# Altium footprint library ICs And Semiconductors SMD.PcbLib: 943 footprints (part 15 of 60)
Each footprint in its own frame and in the unit in brackets; x right, y up, seen from the top. Pads: shape width x height; smd on the part's side, far side on the other; paste and mask are expansions set on the pad; w line width, h text height; cw(c..) or ccw(c..) is an arc to the next point about the centre after c.
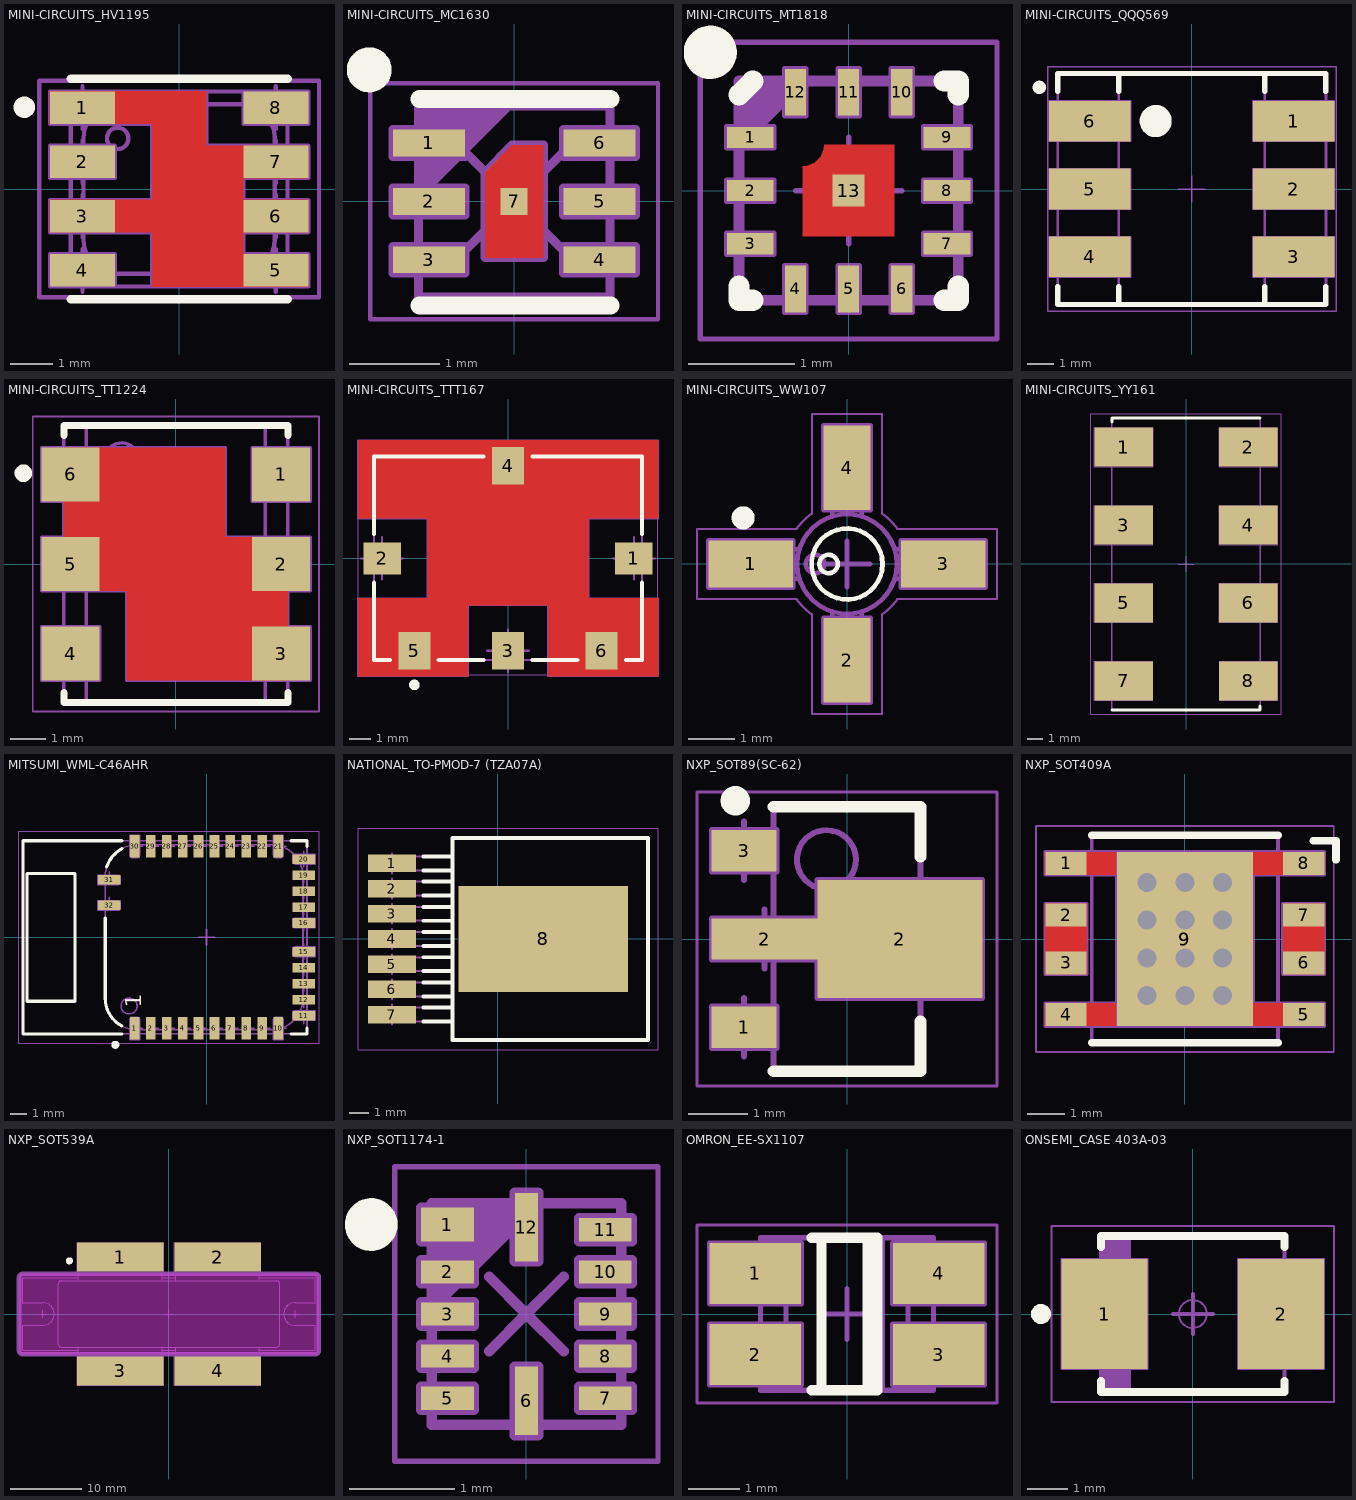
[diagram p14: the footprints below, top view; thin cyan lines are the x and y axes]

## MINI-CIRCUITS_HV1195 [mm] "MINI-CIRCUITS HV1195 Case, 1.27mm pitch; 8 pin, 4.57mm W X 5.08mm L"
height 2.21
pads (8):
  rect 1.52x0.76 smd: 1(-2.265,1.905) 2(-2.265,0.635) 3(-2.265,-0.635) 4(-2.265,-1.905) 5(2.265,-1.905) 6(2.265,-0.635) 7(2.265,0.635) 8(2.265,1.905)
Top Layer:
  region: -0.635,-2.285 -0.635,-1.015 -3.025,-1.015 -3.025,-0.255 -0.635,-0.255 -0.635,1.525 -3.025,1.525 -3.025,2.285 0.635,2.285 0.635,1.015 3.025,1.015 3.025,0.255 1.505,0.255 1.505,-0.255 3.025,-0.255 3.025,-1.015 1.505,-1.015 1.505,-1.525 3.025,-1.525 3.025,-2.285
Top Overlay:
  circle w0.25: c-3.625,1.915 r0.125
  lines w0.2: -2.54,-2.585 2.54,-2.585 ; -2.54,2.586 2.54,2.585
Mechanical 8:
  lines w0.1: -2.765,-1.905 -2.265,-1.905 ; -2.765,-0.635 -2.265,-0.635 ; -2.765,0.635 -2.265,0.635 ; -2.765,1.905 -2.265,1.905 ; -2.265,-2.405 -2.265,-1.905 ; -2.265,-1.405 -2.265,-1.905 ; -2.265,-1.135 -2.265,-0.635 ; -2.265,-0.135 -2.265,-0.635 ; -2.265,0.135 -2.265,0.635 ; -2.265,1.135 -2.265,0.635 ; -2.265,1.405 -2.265,1.905 ; -2.265,2.405 -2.265,1.905 ; -1.765,-1.905 -2.265,-1.905 ; -1.765,-0.635 -2.265,-0.635 ; -1.765,0.635 -2.265,0.635 ; -1.765,1.905 -2.265,1.905 ; -0.5,0 0,0 ; 0,-0.5 0,0 ; 0,0.5 0,0 ; 0.5,0 0,0 ; 1.765,-1.905 2.265,-1.905 ; 1.765,-0.635 2.265,-0.635 ; 1.765,0.635 2.265,0.635 ; 1.765,1.905 2.265,1.905 ; 2.265,-2.405 2.265,-1.905 ; 2.265,-1.405 2.265,-1.905 ; 2.265,-1.135 2.265,-0.635 ; 2.265,-0.135 2.265,-0.635 ; 2.265,0.135 2.265,0.635 ; 2.265,1.135 2.265,0.635 ; 2.265,1.405 2.265,1.905 ; 2.265,2.405 2.265,1.905 ; 2.765,-1.905 2.265,-1.905 ; 2.765,-0.635 2.265,-0.635 ; 2.765,0.635 2.265,0.635 ; 2.765,1.905 2.265,1.905 ; -3.025,-2.285 -1.505,-2.285 -1.505,-1.525 -3.025,-1.525 -3.025,-2.285 ; -3.025,-1.015 -0.635,-1.015 -0.635,-2.285 3.025,-2.285 3.025,-1.525 1.505,-1.525 1.505,-1.015 3.025,-1.015 3.025,-0.255 1.505,-0.255 1.505,0.255 3.025,0.255 3.025,1.015 0.635,1.015 0.635,2.285 -3.025,2.285 -3.025,1.525 -0.635,1.525 -0.635,-0.255 -3.025,-0.255 -3.025,-1.015 ; -3.025,0.255 -1.505,0.255 -1.505,1.015 -3.025,1.015 -3.025,0.255 ; 1.505,1.525 3.025,1.525 3.025,2.285 1.505,2.285 1.505,1.525
Mechanical 14:
  circle w0.1: c-1.44,1.185 r0.25
  lines w0.1: -2.54,-2.285 -2.54,2.285 2.54,2.285 2.54,-2.285 -2.54,-2.285 ; -2.24,-1.185 ccw(c-1.44,-1.185) -1.44,-1.985 1.44,-1.985 ccw(c1.44,-1.185) 2.24,-1.185 2.24,1.185 ccw(c1.44,1.185) 1.44,1.985 -1.44,1.985 ccw(c-1.44,1.185) -2.24,1.185 -2.24,-1.185
Mechanical 15:
  lines w0.1: -3.275,-2.535 3.275,-2.535 3.275,2.534 -3.275,2.535 -3.275,-2.535
3D body "MINI-CIRCUITS_HV1195.stp": height 2.21, standoff 0, extent -2.54,-2.285 2.54,2.285

## MINI-CIRCUITS_MC1630 [mm] "MINI-CIRCUITS MC1630 Case, 0.65mm pitch, 6 pin, 2mm X 2mm X 0.85mm H body (w/thermal tab 0.65 X 1.25mm)"
height 0.85
pads (7):
  rect 0.8x0.3 smd: 1(-0.95,0.65) 2(-0.95,0) 3(-0.95,-0.65) 4(0.95,-0.65) 5(0.95,0) 6(0.95,0.65)
  rect 0.3x0.3 smd: 7(0,0)
Top Layer:
  region: -0.325,-0.625 0.325,-0.625 0.325,0.625 -0.025,0.625 -0.325,0.325
Top Overlay:
  circle w0.25: c-1.613,1.463 r0.125
  lines w0.2: -1.054,-1.16 1.074,-1.16 ; -1.054,1.139 1.074,1.139
Mechanical 8:
  lines w0.1: -0.707,-0.707 0,0 ; -0.707,0.707 0,0 ; 0.707,-0.707 0,0 ; 0.707,0.707 0,0 ; -1.35,-0.8 -0.95,-0.65 -1.35,-0.5 ; -1.35,-0.8 -0.55,-0.8 -0.55,-0.5 -1.35,-0.5 ; -1.35,-0.8 -1.35,-0.5 ; -1.35,-0.15 -0.95,0 -1.35,0.15 ; -1.35,-0.15 -0.55,-0.15 -0.55,0.15 -1.35,0.15 ; -1.35,-0.15 -1.35,0.15 ; -1.35,0.5 -0.95,0.65 -1.35,0.8 ; -1.35,0.5 -0.55,0.5 -0.55,0.8 -1.35,0.8 ; -1.35,0.5 -1.35,0.8 ; 1.35,-0.8 0.95,-0.65 1.35,-0.5 ; 1.35,-0.8 0.55,-0.8 0.55,-0.5 1.35,-0.5 ; 1.35,-0.8 1.35,-0.5 ; 1.35,-0.15 0.95,0 1.35,0.15 ; 1.35,-0.15 0.55,-0.15 0.55,0.15 1.35,0.15 ; 1.35,-0.15 1.35,0.15 ; 1.35,0.5 0.95,0.65 1.35,0.8 ; 1.35,0.5 0.55,0.5 0.55,0.8 1.35,0.8 ; 1.35,0.5 1.35,0.8 ; -0.325,-0.625 -0.325,0.325 -0.025,0.625 0.325,0.625 0.325,-0.625 -0.325,-0.625
Mechanical 14:
  lines w0.1: -1.064,0.064 -0.064,1.064 ; -1.064,0.163 -0.163,1.064 ; -1.064,0.263 -0.263,1.064 ; -1.064,0.363 -0.363,1.064 ; -1.064,0.463 -0.463,1.064 ; -1.064,0.563 -0.564,1.064 ; -1.064,0.663 -0.664,1.064 ; -1.064,0.764 -0.764,1.064 ; -1.064,0.864 -0.864,1.064 ; -1.064,0.964 -0.964,1.064 ; -1.064,-1.064 -1.064,1.064 1.064,1.064 1.064,-1.064 -1.064,-1.064
Mechanical 15:
  lines w0.05: -1.6,-1.314 -1.6,1.314 1.6,1.314 1.6,-1.314 -1.6,-1.314
3D body "MINI-CIRCUITS_MC1630.stp": height 0.85, standoff 0, extent -1.063,-1.063 1.064,1.064

## MINI-CIRCUITS_MT1818 [mm] "MINI-CIRCUITS MT1818 Case, Body 2.06mm L X 2.06mm W X 0.61mm H"
height 0.61
pads (13):
  rect 0.44x0.2 smd: 1(-0.925,0.5) 2(-0.925,0) 3(-0.925,-0.5) 7(0.925,-0.5) 8(0.925,0) 9(0.925,0.5)
  rect 0.2x0.44 smd: 4(-0.5,-0.925) 5(0,-0.925) 6(0.5,-0.925) 10(0.5,0.925) 11(0,0.925) 12(-0.5,0.925)
  rect 0.3x0.3 smd: 13(0,0)
Top Layer:
  region: -0.43,-0.43 0.43,-0.43 0.43,0.43 -0.23,0.43 -0.234,0.391 -0.264,0.319 -0.319,0.264 -0.391,0.234 -0.43,0.23
Top Overlay:
  circle w0.25: c-1.3,1.3 r0.125
  lines w0.2: -1.03,-0.9 -1.03,-1.03 -0.9,-1.03 ; -1.03,0.9 -0.9,1.03 ; 0.9,-1.03 1.03,-1.03 1.03,-0.9 ; 0.9,1.03 1.03,1.03 1.03,0.9
Mechanical 8:
  lines w0.05: -0.5,0 0,0 ; 0,-0.5 0,0 ; 0,0.5 0,0 ; 0.5,0 0,0 ; -1.145,-0.6 -1.145,-0.4 ; -1.145,-0.6 -0.705,-0.6 -0.705,-0.4 -1.145,-0.4 ; -1.145,-0.6 -0.925,-0.5 -1.145,-0.4 ; -1.145,-0.1 -1.145,0.1 ; -1.145,-0.1 -0.705,-0.1 -0.705,0.1 -1.145,0.1 ; -1.145,-0.1 -0.925,0 -1.145,0.1 ; -1.145,0.4 -1.145,0.6 ; -1.145,0.4 -0.705,0.4 -0.705,0.6 -1.145,0.6 ; -1.145,0.4 -0.925,0.5 -1.145,0.6 ; -0.6,-1.145 -0.4,-1.145 ; -0.6,-1.145 -0.6,-0.705 -0.4,-0.705 -0.4,-1.145 ; -0.6,-1.145 -0.5,-0.925 -0.4,-1.145 ; -0.6,1.145 -0.4,1.145 ; -0.6,1.145 -0.6,0.705 -0.4,0.705 -0.4,1.145 ; -0.6,1.145 -0.5,0.925 -0.4,1.145 ; -0.1,-1.145 0.1,-1.145 ; -0.1,-1.145 -0.1,-0.705 0.1,-0.705 0.1,-1.145 ; -0.1,-1.145 0,-0.925 0.1,-1.145 ; -0.1,1.145 0.1,1.145 ; -0.1,1.145 -0.1,0.705 0.1,0.705 0.1,1.145 ; -0.1,1.145 0,0.925 0.1,1.145 ; 0.4,-1.145 0.6,-1.145 ; 0.4,-1.145 0.4,-0.705 0.6,-0.705 0.6,-1.145 ; 0.4,-1.145 0.5,-0.925 0.6,-1.145 ; 0.4,1.145 0.6,1.145 ; 0.4,1.145 0.4,0.705 0.6,0.705 0.6,1.145 ; 0.4,1.145 0.5,0.925 0.6,1.145 ; 1.145,-0.6 1.145,-0.4 ; 1.145,-0.6 0.705,-0.6 0.705,-0.4 1.145,-0.4 ; 1.145,-0.6 0.925,-0.5 1.145,-0.4 ; 1.145,-0.1 1.145,0.1 ; 1.145,-0.1 0.705,-0.1 0.705,0.1 1.145,0.1 ; 1.145,-0.1 0.925,0 1.145,0.1 ; 1.145,0.4 1.145,0.6 ; 1.145,0.4 0.705,0.4 0.705,0.6 1.145,0.6 ; 1.145,0.4 0.925,0.5 1.145,0.6
Mechanical 14:
  lines w0.1: -1.03,0.43 -0.43,1.03 ; -1.03,0.53 -0.53,1.03 ; -1.03,0.63 -0.63,1.03 ; -1.03,0.73 -0.73,1.03 ; -1.03,0.83 -0.83,1.03 ; -1.03,0.93 -0.93,1.03 ; -1.03,-1.03 1.03,-1.03 1.03,1.03 -1.03,1.03 -1.03,-1.03
Mechanical 15:
  lines w0.05: -1.395,-1.395 1.395,-1.395 1.395,1.395 -1.395,1.395 -1.395,-1.395
3D body "MINI-CIRCUITS_MT1818.stp": height 0.61, standoff 0, extent -1.03,-1.03 1.03,1.03

## MINI-CIRCUITS_QQQ569 [mm] "MINI-CIRCUITS QQQ569 Case, 2.54mm pitch; 6 pin, 9.91mm W X 7.87mm L"
height 5.72
pads (6):
  rect 3.05x1.52 smd: 1(3.81,2.54) 2(3.81,0) 3(3.81,-2.54) 4(-3.81,-2.54) 5(-3.81,0) 6(-3.81,2.54)
Top Overlay:
  circle w0.25: c-5.7,3.8 r0.125
  circle w0.6: c-1.35,2.54 r0.3
  lines w0.2: -5.016,-3.65 -5.016,-4.318 5.016,-4.318 5.016,-3.65 ; -5.016,3.65 -5.016,4.318 5.016,4.318 5.016,3.65 ; -2.725,-4.318 -2.725,-3.65 ; -2.725,3.65 -2.725,4.318 ; 2.725,-4.318 2.725,-3.65 ; 2.725,3.65 2.725,4.318
Mechanical 8:
  lines w0.05: -4.31,-2.54 -3.81,-2.54 ; -4.31,0 -3.81,0 ; -4.31,2.54 -3.81,2.54 ; -3.81,-3.04 -3.81,-2.54 ; -3.81,-2.04 -3.81,-2.54 ; -3.81,-0.5 -3.81,0 ; -3.81,0.5 -3.81,0 ; -3.81,2.04 -3.81,2.54 ; -3.81,3.04 -3.81,2.54 ; -3.31,-2.54 -3.81,-2.54 ; -3.31,0 -3.81,0 ; -3.31,2.54 -3.81,2.54 ; -0.5,0 0,0 ; 0,-0.5 0,0 ; 0,0.5 0,0 ; 0.5,0 0,0 ; 3.31,-2.54 3.81,-2.54 ; 3.31,0 3.81,0 ; 3.31,2.54 3.81,2.54 ; 3.81,-3.04 3.81,-2.54 ; 3.81,-2.04 3.81,-2.54 ; 3.81,-0.5 3.81,0 ; 3.81,0.5 3.81,0 ; 3.81,2.04 3.81,2.54 ; 3.81,3.04 3.81,2.54 ; 4.31,-2.54 3.81,-2.54 ; 4.31,0 3.81,0 ; 4.31,2.54 3.81,2.54 ; -5.335,-3.3 -2.285,-3.3 -2.285,-1.78 -5.335,-1.78 -5.335,-3.3 ; -5.335,-0.76 -2.285,-0.76 -2.285,0.76 -5.335,0.76 -5.335,-0.76 ; -5.335,1.78 -2.285,1.78 -2.285,3.3 -5.335,3.3 -5.335,1.78 ; 2.285,-3.3 5.335,-3.3 5.335,-1.78 2.285,-1.78 2.285,-3.3 ; 2.285,-0.76 5.335,-0.76 5.335,0.76 2.285,0.76 2.285,-0.76 ; 2.285,1.78 5.335,1.78 5.335,3.3 2.285,3.3 2.285,1.78
Mechanical 14:
  circle w0.1: c-1.35,2.54 r0.5
  lines w0.1: -5.016,-3.175 -5.016,-4.318 5.016,-4.318 5.016,-3.175 ; -5.016,-1.905 -5.016,-0.635 ; -5.016,0.635 -5.016,1.905 ; -5.016,3.175 -5.016,4.318 5.016,4.318 5.016,3.175 ; -2.725,-4.318 -2.725,4.318 ; 2.725,-4.318 2.725,4.318 ; 5.016,-1.905 5.016,-0.635 ; 5.016,0.635 5.016,1.905 ; -5.143,-3.175 -5.143,-1.905 -3.785,-1.905 -3.785,-3.175 -5.143,-3.175 ; -5.143,-0.635 -3.785,-0.635 -3.785,0.635 -5.143,0.635 -5.143,-0.635 ; -5.143,1.905 -3.785,1.905 -3.785,3.175 -5.143,3.175 -5.143,1.905 ; 3.785,-3.175 5.143,-3.175 5.143,-1.905 3.785,-1.905 3.785,-3.175 ; 3.785,-0.635 3.785,0.635 5.143,0.635 5.143,-0.635 3.785,-0.635 ; 3.785,1.905 3.785,3.175 5.143,3.175 5.143,1.905 3.785,1.905
Mechanical 15:
  lines w0.05: -0.5,0 0.5,0 ; 0,-0.5 0,0.5 ; -5.393,-4.568 5.393,-4.568 5.393,4.568 -5.393,4.568 -5.393,-4.568
3D body "MINI-CIRCUITS_QQQ569.stp": height 5.68, standoff 0, extent -5.143,-4.318 5.144,4.318

## MINI-CIRCUITS_TT1224 [mm] "MINI-CIRCUITS TT1224 Case, 6 pin, 6.35mm W X 7.87mm L"
height 4.06
pads (6):
  rect 1.65x1.52 smd: 1(2.985,2.54) 2(2.985,0) 3(2.985,-2.54) 4(-2.985,-2.54) 5(-2.985,0) 6(-2.985,2.54)
Top Layer:
  region: -3.175,-0.76 -1.395,-0.76 -1.395,-3.3 3.175,-3.3 3.175,0.76 1.395,0.76 1.395,3.3 -3.175,3.3
Top Overlay:
  circle w0.25: c-4.325,2.575 r0.125
  lines w0.2: -3.175,-3.65 -3.175,-3.935 3.175,-3.935 3.175,-3.65 ; -3.175,3.65 -3.175,3.935 3.175,3.935 3.175,3.65
Mechanical 8:
  lines w0.1: -3.485,-2.54 -2.985,-2.54 ; -3.485,0 -2.985,0 ; -3.485,2.54 -2.985,2.54 ; -2.985,-3.04 -2.985,-2.54 ; -2.985,-2.04 -2.985,-2.54 ; -2.985,-0.5 -2.985,0 ; -2.985,0.5 -2.985,0 ; -2.985,2.04 -2.985,2.54 ; -2.985,3.04 -2.985,2.54 ; -2.485,-2.54 -2.985,-2.54 ; -2.485,0 -2.985,0 ; -2.485,2.54 -2.985,2.54 ; -0.5,0 0,0 ; 0,-0.5 0,0 ; 0,0.5 0,0 ; 0.5,0 0,0 ; 2.485,-2.54 2.985,-2.54 ; 2.485,0 2.985,0 ; 2.485,2.54 2.985,2.54 ; 2.985,-3.04 2.985,-2.54 ; 2.985,-2.04 2.985,-2.54 ; 2.985,-0.5 2.985,0 ; 2.985,0.5 2.985,0 ; 2.985,2.04 2.985,2.54 ; 2.985,3.04 2.985,2.54 ; 3.485,-2.54 2.985,-2.54 ; 3.485,0 2.985,0 ; 3.485,2.54 2.985,2.54 ; -3.81,-3.3 -3.81,-1.78 -2.16,-1.78 -2.16,-3.3 -3.81,-3.3 ; -3.81,-0.76 -3.81,0.76 -2.16,0.76 -2.16,-0.76 -3.81,-0.76 ; -3.81,1.78 -3.81,3.3 -2.16,3.3 -2.16,1.78 -3.81,1.78 ; -3.175,-0.76 -1.395,-0.76 -1.395,-3.3 3.175,-3.3 3.175,0.76 1.395,0.76 1.395,3.3 -3.175,3.3 -3.175,-0.76 ; 2.16,-3.3 2.16,-1.78 3.81,-1.78 3.81,-3.3 2.16,-3.3 ; 2.16,-0.76 2.16,0.76 3.81,0.76 3.81,-0.76 2.16,-0.76 ; 2.16,1.78 2.16,3.3 3.81,3.3 3.81,1.78 2.16,1.78
Mechanical 14:
  circle w0.1: c-1.54,2.935 r0.5
  lines w0.1: -2.54,-3.935 -2.54,3.935 ; 2.54,-3.935 2.54,3.935 ; -3.175,-3.935 -3.175,-3.09 ccw(c-3.175,-2.54) -3.175,-1.99 -3.175,-0.55 ccw(c-3.175,0) -3.175,0.55 -3.175,1.99 ccw(c-3.175,2.54) -3.175,3.09 -3.175,3.935 3.175,3.935 3.175,3.09 ccw(c3.175,2.54) 3.175,1.99 3.175,0.55 ccw(c3.175,0) 3.175,-0.55 3.175,-1.99 ccw(c3.175,-2.54) 3.175,-3.09 3.175,-3.935 -3.175,-3.935
Mechanical 15:
  lines w0.05: -4.06,-4.185 4.06,-4.185 4.06,4.185 -4.06,4.185 -4.06,-4.185
3D body "MINI-CIRCUITS_TT1224.stp": height 4.11, standoff 0, extent -3.175,-3.935 3.175,3.935

## MINI-CIRCUITS_TTT167 [mm] "MINI-CIRCUITS TTT167 Case, 6 pin, 9.65mm W X 12.7mm L"
height 5.84
pads (6):
  rect 1.78x1.52 smd: 1(5.97,0) 2(-5.97,0)
  rect 1.52x1.78 smd: 3(0,-4.38) 4(0,4.38) 5(-4.44,-4.38) 6(4.44,-4.38)
Top Layer:
  region: -7.112,-1.903 -3.81,-1.903 -3.81,1.903 -7.112,1.903 -7.112,5.588 7.112,5.588 7.112,1.903 3.81,1.903 3.81,-1.903 7.112,-1.903 7.112,-5.588 1.903,-5.588 1.903,-2.22 -1.903,-2.22 -1.903,-5.588 -7.112,-5.588
Top Overlay:
  circle w0.25: c-4.44,-6 r0.125
  lines w0.2: -6.35,-1.16 -6.35,-4.825 -5.6,-4.825 ; -6.35,1.16 -6.35,4.825 -1.16,4.825 ; -3.28,-4.825 -1.16,-4.825 ; 1.16,-4.825 3.28,-4.825 ; 1.16,4.825 6.35,4.825 6.35,1.16 ; 5.6,-4.825 6.35,-4.825 6.35,-1.16
Mechanical 8:
  lines w0.1: -6.97,0 -5.97,0 ; -5.97,-1 -5.97,0 ; -5.97,1 -5.97,0 ; -5.44,-4.38 -4.44,-4.38 ; -4.97,0 -5.97,0 ; -4.44,-5.38 -4.44,-4.38 ; -4.44,-3.38 -4.44,-4.38 ; -3.44,-4.38 -4.44,-4.38 ; -1,-4.38 0,-4.38 ; -1,0 0,0 ; -1,4.38 0,4.38 ; 0,-5.38 0,-4.38 ; 0,-3.38 0,-4.38 ; 0,-1 0,0 ; 0,1 0,0 ; 0,3.38 0,4.38 ; 0,5.38 0,4.38 ; 1,-4.38 0,-4.38 ; 1,0 0,0 ; 1,4.38 0,4.38 ; 3.44,-4.38 4.44,-4.38 ; 4.44,-5.38 4.44,-4.38 ; 4.44,-3.38 4.44,-4.38 ; 4.97,0 5.97,0 ; 5.44,-4.38 4.44,-4.38 ; 5.97,-1 5.97,0 ; 5.97,1 5.97,0 ; 6.97,0 5.97,0 ; -7.112,-5.588 -1.903,-5.588 -1.903,-2.22 1.903,-2.22 1.903,-5.588 7.112,-5.588 7.112,-1.903 3.81,-1.903 3.81,1.903 7.112,1.903 7.112,5.588 -7.112,5.588 -7.112,1.903 -3.81,1.903 -3.81,-1.903 -7.112,-1.903 -7.112,-5.588
Mechanical 14:
  circle w0.1: c-4.44,-3 r0.4
  lines w0.1: -6.35,-4.825 -4.99,-4.825 cw(c-4.44,-4.825) -3.89,-4.825 -0.55,-4.825 cw(c0,-4.825) 0.55,-4.825 3.89,-4.825 cw(c4.44,-4.825) 4.99,-4.825 6.35,-4.825 6.35,-0.55 cw(c6.35,0) 6.35,0.55 6.35,4.825 0.55,4.825 cw(c0,4.825) -0.55,4.825 -6.35,4.825 -6.35,0.55 cw(c-6.35,0) -6.35,-0.55 -6.35,-4.825
Mechanical 15:
  lines w0.05: -7.11,-5.52 7.11,-5.52 7.11,5.52 -7.11,5.52 -7.11,-5.52
3D body "MINI-CIRCUITS_TTT167.stp": height 5.84, standoff 0, extent -6.35,-4.825 6.35,4.825

## MINI-CIRCUITS_WW107 [mm] "MINI-CIRCUITS WW107 Case"
height 1.52
pads (4):
  rect 1.83x1.02 smd: 1(-2.085,0) 3(2.085,0)
  rect 1.02x1.83 smd: 2(0,-2.085) 4(0,2.085)
Top Overlay:
  circle w0.25: c-2.25,1 r0.125
  circle w0.1: c0,0 r0.77
  circle w0.1: c-0.4,0 r0.2
Mechanical 8:
  lines w0.1: -2.585,0 -2.085,0 ; -2.085,-0.5 -2.085,0 ; -2.085,0.5 -2.085,0 ; -1.585,0 -2.085,0 ; -0.5,-2.085 0,-2.085 ; -0.5,0 0,0 ; -0.5,2.085 0,2.085 ; 0,-2.585 0,-2.085 ; 0,-1.585 0,-2.085 ; 0,-0.5 0,0 ; 0,0.5 0,0 ; 0,1.585 0,2.085 ; 0,2.585 0,2.085 ; 0.5,-2.085 0,-2.085 ; 0.5,0 0,0 ; 0.5,2.085 0,2.085 ; 1.585,0 2.085,0 ; 2.085,-0.5 2.085,0 ; 2.085,0.5 2.085,0 ; 2.585,0 2.085,0 ; -3,-0.51 -1.17,-0.51 -1.17,0.51 -3,0.51 -3,-0.51 ; -0.51,-3 0.51,-3 0.51,-1.17 -0.51,-1.17 -0.51,-3 ; -0.51,1.17 0.51,1.17 0.51,3 -0.51,3 -0.51,1.17 ; 1.17,-0.51 3,-0.51 3,0.51 1.17,0.51 1.17,-0.51
Mechanical 14:
  circle w0.1: c-0.691,0 r0.2
  circle w0.1: c0,0 r1.08
  lines w0.1: -1.029,-0.318 -2.84,-0.318 -2.84,-0.182 -2.34,0.318 -1.029,0.318 ; -0.318,-1.029 -0.318,-2.54 0.318,-2.54 0.318,-1.029 ; -0.318,1.029 -0.318,2.54 0.318,2.54 0.318,1.029 ; 1.029,-0.318 2.54,-0.318 2.54,0.318 1.029,0.318
Mechanical 15:
  lines w0.05: -3.25,-0.76 -3.25,0.76 -1.091,0.76 cw(c0,0) -0.76,1.091 -0.76,3.25 0.76,3.25 0.76,1.091 cw(c0,0) 1.091,0.76 3.25,0.76 3.25,-0.76 1.091,-0.76 cw(c0,0) 0.76,-1.092 0.76,-3.25 -0.76,-3.25 -0.76,-1.092 cw(c0,0) -1.091,-0.76 -3.25,-0.76
3D body "MINI-CIRCUITS_WW107.stp": height 1.52, standoff 0, extent -2.84,-2.54 2.54,2.54

## MINI-CIRCUITS_YY161 [mm] "MINI-CIRCUITS YY161 Case, Body 19.05mm L X 9.65mm W X 7.11mm H"
height 4.11
pads (8):
  rect 3.81x2.54 smd: 1(-4.065,7.62) 2(4.065,7.62) 3(-4.065,2.54) 4(4.065,2.54) 5(-4.065,-2.54) 6(4.065,-2.54) 7(-4.065,-7.62) 8(4.065,-7.62)
Top Overlay:
  lines w0.2: -4.825,-9.525 4.825,-9.525 4.825,-9.24 ; -4.825,9.24 -4.825,9.525 4.825,9.525
Mechanical 8:
  lines w0.05: -4.565,-7.62 -4.065,-7.62 ; -4.565,-2.54 -4.065,-2.54 ; -4.565,2.54 -4.065,2.54 ; -4.565,7.62 -4.065,7.62 ; -4.065,-8.12 -4.065,-7.62 ; -4.065,-7.12 -4.065,-7.62 ; -4.065,-3.04 -4.065,-2.54 ; -4.065,-2.04 -4.065,-2.54 ; -4.065,2.04 -4.065,2.54 ; -4.065,3.04 -4.065,2.54 ; -4.065,7.12 -4.065,7.62 ; -4.065,8.12 -4.065,7.62 ; -3.565,-7.62 -4.065,-7.62 ; -3.565,-2.54 -4.065,-2.54 ; -3.565,2.54 -4.065,2.54 ; -3.565,7.62 -4.065,7.62 ; -0.5,0 0,0 ; 0,-0.5 0,0 ; 0,0.5 0,0 ; 0.5,0 0,0 ; 3.565,-7.62 4.065,-7.62 ; 3.565,-2.54 4.065,-2.54 ; 3.565,2.54 4.065,2.54 ; 3.565,7.62 4.065,7.62 ; 4.065,-8.12 4.065,-7.62 ; 4.065,-7.12 4.065,-7.62 ; 4.065,-3.04 4.065,-2.54 ; 4.065,-2.04 4.065,-2.54 ; 4.065,2.04 4.065,2.54 ; 4.065,3.04 4.065,2.54 ; 4.065,7.12 4.065,7.62 ; 4.065,8.12 4.065,7.62 ; 4.565,-7.62 4.065,-7.62 ; 4.565,-2.54 4.065,-2.54 ; 4.565,2.54 4.065,2.54 ; 4.565,7.62 4.065,7.62 ; -5.97,-8.89 -2.16,-8.89 -2.16,-6.35 -5.97,-6.35 -5.97,-8.89 ; -5.97,-3.81 -2.16,-3.81 -2.16,-1.27 -5.97,-1.27 -5.97,-3.81 ; -5.97,1.27 -2.16,1.27 -2.16,3.81 -5.97,3.81 -5.97,1.27 ; -5.97,6.35 -2.16,6.35 -2.16,8.89 -5.97,8.89 -5.97,6.35 ; 2.16,-8.89 5.97,-8.89 5.97,-6.35 2.16,-6.35 2.16,-8.89 ; 2.16,-3.81 5.97,-3.81 5.97,-1.27 2.16,-1.27 2.16,-3.81 ; 2.16,1.27 5.97,1.27 5.97,3.81 2.16,3.81 2.16,1.27 ; 2.16,6.35 5.97,6.35 5.97,8.89 2.16,8.89 2.16,6.35
Mechanical 14:
  circle w0.1: c-2.825,7.525 r0.5
  lines w0.1: -4.825,-7.875 -5.71,-7.875 -5.71,-7.365 -4.825,-7.365 ; -4.825,-2.795 -5.71,-2.795 -5.71,-2.285 -4.825,-2.285 ; -4.825,2.285 -5.71,2.285 -5.71,2.795 -4.825,2.795 ; -4.825,7.365 -5.71,7.365 -5.71,7.875 -4.825,7.875 ; 4.825,-7.875 5.71,-7.875 5.71,-7.365 4.825,-7.365 ; 4.825,-2.795 5.71,-2.795 5.71,-2.285 4.825,-2.285 ; 4.825,2.285 5.71,2.285 5.71,2.795 4.825,2.795 ; 4.825,7.365 5.71,7.365 5.71,7.875 4.825,7.875 ; -4.825,-9.525 -4.825,9.525 4.825,9.525 4.825,-9.525 -4.825,-9.525
Mechanical 15:
  lines w0.05: -6.22,-9.775 6.22,-9.775 6.22,9.775 -6.22,9.775 -6.22,-9.775
3D body "MINI-CIRCUITS_YY161.stp": height 7.11, standoff 0, extent -5.71,-9.525 5.71,9.525

## MITSUMI_WML-C46AHR [mm] "QFP,0.80mm Pitch, Square; 32 Pin, 7.00mm L X 7.00mm W X 1.60mm H Body, IPC Medium Density"
height 1.6
pads (32):
  rect 0.6x1.4 smd: 1(-4.5,-5.7) 2(-3.5,-5.7) 3(-2.5,-5.7) 4(-1.5,-5.7) 5(-0.5,-5.7) 6(0.5,-5.7) 7(1.5,-5.7) 8(2.5,-5.7) 9(3.5,-5.7) 10(4.5,-5.7) 21(4.5,5.7) 22(3.5,5.7) 23(2.5,5.7) 24(1.5,5.7) 25(0.5,5.7) 26(-0.5,5.7) 27(-1.5,5.7) 28(-2.5,5.7) 29(-3.5,5.7) 30(-4.5,5.7)
  rect 1.4x0.6 smd: 11(6.1,-4.9) 12(6.1,-3.9) 13(6.1,-2.9) 14(6.1,-1.9) 15(6.1,-0.9) 16(6.1,0.9) 17(6.1,1.9) 18(6.1,2.9) 19(6.1,3.9) 20(6.1,4.9) 31(-6.1,3.6) 32(-6.1,2)
Top Overlay:
  circle w0.25: c-5.715,-6.731 r0.125
  lines w0.2: -6.35,1.2 -6.35,-3.8 ccw(c-4.35,-3.8) -5.3,-5.56 ; -6.258,4.4 cw(c-4.35,3.8) -5.3,5.56 ; -5.3,-6.05 -11.5,-6.05 -11.5,6.05 -5.3,6.05 ; 5.3,-6.05 6.3,-6.05 6.3,-5.7 ; 5.3,6.05 6.3,6.05 6.3,5.7 ; -11.25,-4 -11.25,4 -8.25,4 -8.25,-4 -11.25,-4
  text "1" at -4.075,-4.425 h1
Mechanical 8:
  drawing of 162 lines, arcs and shapes, not listed
  text "16" at 4.445,0.635 h0.5
  text "15" at 4.445,-1.143 h0.5
  text "32" at -5.08,1.778 h0.5
  text "31" at -5.08,3.302 h0.5
  text "21" at 4.191,4.318 h0.5
  text "30" at -4.826,4.191 h0.5
  text "10" at 4.699,-4.699 h0.5
Mechanical 14:
  circle w0.1: c-4.85,-4.3 r0.5
  lines w0.1: -11.5,-6.05 6.3,-6.05 6.3,6.05 -11.5,6.05 -11.5,-6.05 ; -11.25,-4 -11.25,4 -8.25,4 -8.25,-4 -11.25,-4 ; -6.35,-3.8 ccw(c-4.35,-3.8) -4.35,-5.8 4.05,-5.8 ccw(c4.05,-3.8) 6.05,-3.8 6.05,3.8 ccw(c4.05,3.8) 4.05,5.8 -4.35,5.8 ccw(c-4.35,3.8) -6.35,3.8 -6.35,-3.8
Mechanical 15:
  lines w0.05: -11.75,-6.65 7.05,-6.65 7.05,6.65 -11.75,6.65 -11.75,-6.65
3D body "MITSUMI_WML-C46AHR.stp": height 2, standoff 0, extent -11.5,-6.05 6.3,6.05

## NATIONAL_TO-PMOD-7 (TZA07A) [mm] "TO-PMOD 7 Pin Package, NATIONAL Package TZA07A, 1.70mm pitch; 9.85mm L X 10.16mm W X 4.67mm H body"
height 4.67
pads (8):
  rect 2.41x0.89 smd: 1(-5.339,3.81) 2(-5.339,2.54) 3(-5.339,1.27) 4(-5.339,0) 5(-5.339,-1.27) 6(-5.339,-2.54) 7(-5.339,-3.81)
  rect 8.54x5.35 smd: 8(2.291,0)
Top Overlay:
  lines w0.2: -3.734,-4.16 -2.279,-4.16 ; -3.734,-3.46 -2.279,-3.46 ; -3.734,-2.89 -2.279,-2.89 ; -3.734,-2.19 -2.279,-2.19 ; -3.734,-1.62 -2.279,-1.62 ; -3.734,-0.92 -2.279,-0.92 ; -3.734,-0.35 -2.279,-0.35 ; -3.734,0.35 -2.279,0.35 ; -3.734,0.92 -2.279,0.92 ; -3.734,1.62 -2.279,1.62 ; -3.734,2.19 -2.279,2.19 ; -3.734,2.89 -2.279,2.89 ; -3.734,3.46 -2.279,3.46 ; -3.734,4.16 -2.279,4.16 ; -2.279,-5.08 -2.279,5.08 7.571,5.08 7.571,-5.08 -2.279,-5.08
Mechanical 8:
  lines w0.1: -5.839,-3.81 -5.339,-3.81 ; -5.839,-2.54 -5.339,-2.54 ; -5.839,-1.27 -5.339,-1.27 ; -5.839,0 -5.339,0 ; -5.839,1.27 -5.339,1.27 ; -5.839,2.54 -5.339,2.54 ; -5.839,3.81 -5.339,3.81 ; -5.339,-4.31 -5.339,-3.81 ; -5.339,-3.31 -5.339,-3.81 ; -5.339,-3.04 -5.339,-2.54 ; -5.339,-2.04 -5.339,-2.54 ; -5.339,-1.77 -5.339,-1.27 ; -5.339,-0.77 -5.339,-1.27 ; -5.339,-0.5 -5.339,0 ; -5.339,0.5 -5.339,0 ; -5.339,0.77 -5.339,1.27 ; -5.339,1.77 -5.339,1.27 ; -5.339,2.04 -5.339,2.54 ; -5.339,3.04 -5.339,2.54 ; -5.339,3.31 -5.339,3.81 ; -5.339,4.31 -5.339,3.81 ; -4.839,-3.81 -5.339,-3.81 ; -4.839,-2.54 -5.339,-2.54 ; -4.839,-1.27 -5.339,-1.27 ; -4.839,0 -5.339,0 ; -4.839,1.27 -5.339,1.27 ; -4.839,2.54 -5.339,2.54 ; -4.839,3.81 -5.339,3.81 ; 1.791,0 2.291,0 ; 2.291,-0.5 2.291,0 ; 2.291,0.5 2.291,0 ; 2.791,0 2.291,0
Mechanical 14:
  lines w0.1: -2.279,-4.16 -6.199,-4.16 -6.199,-3.46 -2.279,-3.46 ; -2.279,-2.89 -6.199,-2.89 -6.199,-2.19 -2.279,-2.19 ; -2.279,-1.62 -6.199,-1.62 -6.199,-0.92 -2.279,-0.92 ; -2.279,-0.35 -6.199,-0.35 -6.199,0.35 -2.279,0.35 ; -2.279,0.92 -6.199,0.92 -6.199,1.62 -2.279,1.62 ; -2.279,2.19 -6.199,2.19 -6.199,2.89 -2.279,2.89 ; -2.279,3.46 -6.199,3.46 -6.199,4.16 -2.279,4.16 ; -2.279,-5.08 -2.279,5.08 7.571,5.08 7.571,-5.08 -2.279,-5.08
Mechanical 15:
  lines w0.05: -0.5,0 0,0 ; 0,-0.5 0,0 ; 0,0.5 0,0 ; 0.5,0 0,0 ; -7.044,-5.58 -7.044,5.58 8.071,5.58 8.071,-5.58 -7.044,-5.58
3D body "NATIONAL_TO-PMOD-7 (TZA07A).stp": height 4.77, standoff 0, extent -6.199,-5.08 7.571,5.08

## NXP_SOT89(SC-62) [mm] "SOT89, (SC-62), TO-243, 3-Leads, Body 2.5x4.5mm"
height 1.2
pads (4):
  rect 1.1x0.7 smd: 1(-1.75,-1.5) 3(-1.75,1.5)
  rect 1.8x0.7 smd: 2(-1.4,0)
  rect 2.8x2 smd: 2(0.9,0)
Top Overlay:
  circle w0.25: c-1.9,2.35 r0.125
  lines w0.2: -1.25,-2.25 1.25,-2.25 1.25,-1.4 ; -1.25,2.25 1.25,2.25 1.25,1.4
Mechanical 8:
  lines w0.1: -2.25,-1.5 -1.75,-1.5 ; -2.25,1.5 -1.75,1.5 ; -1.9,0 -1.4,0 ; -1.75,-2 -1.75,-1.5 ; -1.75,-1 -1.75,-1.5 ; -1.75,1 -1.75,1.5 ; -1.75,2 -1.75,1.5 ; -1.4,-0.5 -1.4,0 ; -1.4,0.5 -1.4,0 ; -1.25,-1.5 -1.75,-1.5 ; -1.25,1.5 -1.75,1.5 ; -0.9,0 -1.4,0 ; -0.5,0 0,0 ; 0,-0.5 0,0 ; 0,0.5 0,0 ; 0.4,0 0.9,0 ; 0.5,0 0,0 ; 0.9,-0.5 0.9,0 ; 0.9,0.5 0.9,0 ; 1.4,0 0.9,0 ; -2.3,-1.85 -1.2,-1.85 -1.2,-1.15 -2.3,-1.15 -2.3,-1.85 ; -2.3,-0.35 -0.5,-0.35 -0.5,-1 2.3,-1 2.3,1 -0.5,1 -0.5,0.35 -2.3,0.35 -2.3,-0.35 ; -2.3,1.15 -1.2,1.15 -1.2,1.85 -2.3,1.85 -2.3,1.15
Mechanical 14:
  circle w0.1: c-0.35,1.35 r0.5
  lines w0.1: -1.25,-1.707 -1.25,-1.293 ; -1.25,1.293 -1.25,1.707 ; -1.25,-2.25 -1.25,2.25 1.25,2.25 1.25,-2.25 -1.25,-2.25
Mechanical 15:
  lines w0.05: -2.55,-2.5 -2.55,2.5 2.55,2.5 2.55,-2.5 -2.55,-2.5
3D body "NXP_SOT89(SC-62).stp": height 1.6, standoff 0, extent -2.25,-2.25 2.25,2.25

## NXP_SOT409A [mm] "SOT409A, 1.27mm pitch; 8 pin, 4.47mm W X 5.485mm L X 2.36mm H body (w/thermal tab 3.6mm X 4.6mm)"
height 2.36
pads (10):
  rect 1.09x0.6 smd: 1(-3.145,2) 2(-3.145,0.635) 3(-3.145,-0.635) 4(-3.145,-2) 5(3.145,-2) 6(3.145,-0.635) 7(3.145,0.635) 8(3.145,2)
  rect 3.6x4.6 smd: 9(0,0)
  rect 3.6x4.6 smd far side paste-3.61: 9(0,0)
via 1,-1.5 diameter 0.8 hole 0.5
via 0,-1.5 diameter 0.8 hole 0.5
via -1,-1.5 diameter 0.8 hole 0.5
via 1,-0.5 diameter 0.8 hole 0.5
via 0,-0.5 diameter 0.8 hole 0.5
via -1,-0.5 diameter 0.8 hole 0.5
via -1,0.5 diameter 0.8 hole 0.5
via 0,0.5 diameter 0.8 hole 0.5
via 1,0.5 diameter 0.8 hole 0.5
via 1,1.5 diameter 0.8 hole 0.5
via 0,1.5 diameter 0.8 hole 0.5
via -1,1.5 diameter 0.8 hole 0.5
Top Layer:
  region: 2.6,0.935 3.69,0.935 3.69,-0.935 2.6,-0.935
  region: -3.69,0.935 -2.6,0.935 -2.6,-0.935 -3.69,-0.935
  region: -3.69,-2.3 -3.69,-1.7 -1.8,-1.7 -1.8,1.7 -3.69,1.7 -3.69,2.3 3.69,2.3 3.69,1.7 1.8,1.7 1.8,-1.7 3.69,-1.7 3.69,-2.3
Top Overlay:
  lines w0.2: -2.465,-2.743 2.465,-2.743 ; -2.465,2.743 2.465,2.743 ; 3.4,2.6 4,2.6 4,2.1
Top Paste:
  region: -1.06,0.25 1.06,0.25 1.06,1.81 -1.06,1.81
  region: -1.06,-1.81 1.06,-1.81 1.06,-0.25 -1.06,-0.25
Mechanical 8:
  lines w0.1: -3.445,-2 -3.145,-2 ; -3.445,-0.635 -3.145,-0.635 ; -3.445,0.635 -3.145,0.635 ; -3.445,2 -3.145,2 ; -3.145,-2.3 -3.145,-2 ; -3.145,-1.7 -3.145,-2 ; -3.145,-0.935 -3.145,-0.635 ; -3.145,-0.335 -3.145,-0.635 ; -3.145,0.335 -3.145,0.635 ; -3.145,0.935 -3.145,0.635 ; -3.145,1.7 -3.145,2 ; -3.145,2.3 -3.145,2 ; -2.845,-2 -3.145,-2 ; -2.845,-0.635 -3.145,-0.635 ; -2.845,0.635 -3.145,0.635 ; -2.845,2 -3.145,2 ; -1.3,-1.5 -1,-1.5 ; -1.3,-0.5 -1,-0.5 ; -1.3,0.5 -1,0.5 ; -1.3,1.5 -1,1.5 ; -1,-1.8 -1,-1.5 ; -1,-1.2 -1,-1.5 ; -1,-0.8 -1,-0.5 ; -1,-0.2 -1,-0.5 ; -1,0.2 -1,0.5 ; -1,0.8 -1,0.5 ; -1,1.2 -1,1.5 ; -1,1.8 -1,1.5 ; -0.7,-1.5 -1,-1.5 ; -0.7,-0.5 -1,-0.5 ; -0.7,0.5 -1,0.5 ; -0.7,1.5 -1,1.5 ; -0.3,-1.5 0,-1.5 ; -0.3,-0.5 0,-0.5 ; -0.3,0 0,0 ; -0.3,0.5 0,0.5 ; -0.3,1.5 0,1.5 ; 0,-1.8 0,-1.5 ; 0,-1.2 0,-1.5 ; 0,-0.8 0,-0.5 ; 0,-0.3 0,0 ; 0,-0.2 0,-0.5 ; 0,0.2 0,0.5 ; 0,0.3 0,0 ; 0,0.8 0,0.5 ; 0,1.2 0,1.5 ; 0,1.8 0,1.5 ; 0.3,-1.5 0,-1.5 ; 0.3,-0.5 0,-0.5 ; 0.3,0 0,0 ; 0.3,0.5 0,0.5 ; 0.3,1.5 0,1.5 ; 0.7,-1.5 1,-1.5 ; 0.7,-0.5 1,-0.5 ; 0.7,0.5 1,0.5 ; 0.7,1.5 1,1.5 ; 1,-1.8 1,-1.5 ; 1,-1.2 1,-1.5 ; 1,-0.8 1,-0.5 ; 1,-0.2 1,-0.5 ; 1,0.2 1,0.5 ; 1,0.8 1,0.5 ; 1,1.2 1,1.5 ; 1,1.8 1,1.5 ; 1.3,-1.5 1,-1.5 ; 1.3,-0.5 1,-0.5 ; 1.3,0.5 1,0.5 ; 1.3,1.5 1,1.5 ; 2.845,-2 3.145,-2 ; 2.845,-0.635 3.145,-0.635 ; 2.845,0.635 3.145,0.635 ; 2.845,2 3.145,2 ; 3.145,-2.3 3.145,-2 ; 3.145,-1.7 3.145,-2 ; 3.145,-0.935 3.145,-0.635 ; 3.145,-0.335 3.145,-0.635 ; 3.145,0.335 3.145,0.635 ; 3.145,0.935 3.145,0.635 ; 3.145,1.7 3.145,2 ; 3.145,2.3 3.145,2 ; 3.445,-2 3.145,-2 ; 3.445,-0.635 3.145,-0.635 ; 3.445,0.635 3.145,0.635 ; 3.445,2 3.145,2 ; -3.69,-2.3 3.69,-2.3 3.69,-1.7 1.8,-1.7 1.8,1.7 3.69,1.7 3.69,2.3 -3.69,2.3 -3.69,1.7 -1.8,1.7 -1.8,-1.7 -3.69,-1.7 -3.69,-2.3 ; -3.69,-0.935 -3.69,0.935 -2.6,0.935 -2.6,-0.935 -3.69,-0.935 ; 2.6,-0.935 2.6,0.935 3.69,0.935 3.69,-0.935 2.6,-0.935
Mechanical 14:
  lines w0.1: 3.381,2.3 3.69,1.991 ; 3.523,2.3 3.69,2.133 ; 3.664,2.3 3.69,2.274 ; -2.465,-2.743 2.465,-2.743 2.465,2.743 -2.465,2.743 -2.465,-2.743 ; 3.24,2.3 3.69,1.85 3.69,2.3 3.24,2.3
Mechanical 15:
  circle w0.05: c0,0 r0.35
  lines w0.05: -0.5,0 0.5,0 ; 0,-0.5 0,0.5 ; -3.94,-2.993 -3.94,2.993 3.94,2.993 3.94,-2.993 -3.94,-2.993
Drill Drawing:
  lines w0.1: -1.8,-2.3 -1.8,2.3 1.8,2.3 1.8,-2.3 -1.8,-2.3
  text "Capped Via" at -2.1,-2.725 h0.6
  text "Filled and" at -3.075,-2.725 h0.6
3D body "NXP_SOT409A.stp": height 2.36, standoff 0, extent -3.682,-2.742 3.683,2.743

## NXP_SOT539A [mm] "SOT539A Flanged balanced LDMOST ceramic package; 2 mounting holes; 4 leads"
height 5.33
pads (4):
  rect 12.2x4.1 smd: 1(-6.86,8.018) 2(6.86,8.018) 3(-6.86,-8.018) 4(6.86,-8.018)
Top Overlay:
  circle w0.5: c-14.05,7.5 r0.25
Keep-Out Layer:
  board cut-out: -20.64,-5.65 -20.74,-5.65 -20.923,-5.574 -21.064,-5.433 -21.14,-5.249 -21.14,-5.15 -21.14,5.15 -21.14,5.249 -21.064,5.433 -20.923,5.574 -20.74,5.65 -20.64,5.65 20.66,5.65 20.759,5.65 20.943,5.574 21.084,5.433 21.16,5.249 21.16,5.15 21.16,-5.15 21.16,-5.249 21.084,-5.433 20.943,-5.574 20.759,-5.65 20.66,-5.65
Mechanical 1:
  lines w0.635: -21.15,-5.15 ccw(c-20.65,-5.15) -20.65,-5.65 20.65,-5.65 ccw(c20.65,-5.15) 21.15,-5.15 21.15,5.15 ccw(c20.65,5.15) 20.65,5.65 -20.65,5.65 ccw(c-20.65,5.15) -21.15,5.15 -21.15,-5.15
Mechanical 8:
  lines w0.1: -18.28,0 -17.78,0 ; -17.78,-0.5 -17.78,0 ; -17.78,0.5 -17.78,0 ; -17.28,0 -17.78,0 ; -7.36,-8.018 -6.86,-8.018 ; -7.36,8.018 -6.86,8.018 ; -6.86,-8.518 -6.86,-8.018 ; -6.86,-7.518 -6.86,-8.018 ; -6.86,7.518 -6.86,8.018 ; -6.86,8.518 -6.86,8.018 ; -6.36,-8.018 -6.86,-8.018 ; -6.36,8.018 -6.86,8.018 ; -0.5,0 0,0 ; 0,-0.5 0,0 ; 0,0.5 0,0 ; 0.5,0 0,0 ; 6.36,-8.018 6.86,-8.018 ; 6.36,8.018 6.86,8.018 ; 6.86,-8.518 6.86,-8.018 ; 6.86,-7.518 6.86,-8.018 ; 6.86,7.518 6.86,8.018 ; 6.86,8.518 6.86,8.018 ; 7.36,-8.018 6.86,-8.018 ; 7.36,8.018 6.86,8.018 ; 17.28,0 17.78,0 ; 17.78,-0.5 17.78,0 ; 17.78,0.5 17.78,0 ; 18.28,0 17.78,0 ; -12.96,-10.068 -0.76,-10.068 -0.76,-5.968 -12.96,-5.968 -12.96,-10.068 ; -12.96,5.968 -12.96,10.068 -0.76,10.068 -0.76,5.968 -12.96,5.968 ; 0.76,-10.068 12.96,-10.068 12.96,-5.968 0.76,-5.968 0.76,-10.068 ; 0.76,5.968 0.76,10.068 12.96,10.068 12.96,5.968 0.76,5.968
Mechanical 14:
  lines w0.1: -12.765,-5.145 -20.64,-5.145 -20.64,-1.587 -17.78,-1.587 ccw(c-17.78,0) -17.78,1.587 -20.64,1.587 -20.64,5.145 -12.765,5.145 ; -0.955,-5.145 0.955,-5.145 ; -0.955,5.145 0.955,5.145 ; 12.765,-5.145 20.64,-5.145 20.64,-1.587 17.78,-1.587 cw(c17.78,0) 17.78,1.587 20.64,1.587 20.64,5.145 12.765,5.145 ; -15.623,-4.2 ccw(c-15.123,-4.2) -15.123,-4.7 15.123,-4.7 ccw(c15.123,-4.2) 15.623,-4.2 15.623,4.2 ccw(c15.123,4.2) 15.123,4.7 -15.123,4.7 ccw(c-15.123,4.2) -15.623,4.2 -15.623,-4.2 ; -12.765,-8.56 -0.955,-8.56 -0.955,-4.7 -12.765,-4.7 -12.765,-8.56 ; -12.765,4.7 -0.955,4.7 -0.955,8.56 -11.565,8.56 -12.765,7.36 -12.765,4.7 ; 0.955,-8.56 0.955,-4.7 12.765,-4.7 12.765,-8.56 0.955,-8.56 ; 0.955,4.7 0.955,7.36 2.155,8.56 12.765,8.56 12.765,4.7 0.955,4.7
Drill Drawing:
  lines w0.1: -20.21,2.598 -21.15,2.94 ; -20.21,3.282 -21.15,2.94 ; -18.772,-4.71 -18.43,-5.65 ; -18.772,4.71 -18.43,5.65 ; -18.088,-4.71 -18.43,-5.65 ; -18.088,4.71 -18.43,5.65 ; -0.5,0 0,0 ; 0,-0.5 0,0 ; 0,0.5 0,0 ; 0.5,0 0,0 ; 14.819,-4.052 19.552,-4.052 21.004,-5.504 ; 20.097,-5.081 21.004,-5.504 ; 20.21,2.598 21.15,2.94 ; 20.21,3.282 21.15,2.94 ; 20.581,-4.597 21.004,-5.504 ; -21.15,2.94 21.15,2.94 ; -18.43,-5.65 -18.43,5.65 ; -21.15,-5.15 ccw(c-20.65,-5.15) -20.65,-5.65 20.65,-5.65 ccw(c20.65,-5.15) 21.15,-5.15 21.15,5.15 ccw(c20.65,5.15) 20.65,5.65 -20.65,5.65 ccw(c-20.65,5.15) -21.15,5.15 -21.15,-5.15
  text "42.3" at -4.271,3.149 h1
  text "11.3" at -18.639,-1.021 h1
  text "r0.5" at 14.748,-3.843 h1
3D body "NXP_SOT539A.stp": height 3.03, standoff -2.3, extent -20.64,-8.56 20.64,8.56

## NXP_SOT1174-1 [mm] "NXP SOT1174-1, Plastic, Extremely Thin Quad Flat Package; No Leads; 12 Terminals; Body 1.70 x 2.00 x 0.50 mm"
height 0.5
pads (12):
  rect 0.5x0.32 smd: 1(-0.75,0.85)
  rect 0.5x0.22 smd: 2(-0.75,0.4) 3(-0.75,0) 4(-0.75,-0.4) 5(-0.75,-0.8) 7(0.75,-0.8) 8(0.75,-0.4) 9(0.75,0) 10(0.75,0.4) 11(0.75,0.8)
  rect 0.22x0.65 smd: 6(0,-0.825) 12(0,0.825)
Top Overlay:
  circle w0.25: c-1.475,0.85 r0.125
Mechanical 8:
  lines w0.1: -0.354,-0.354 0,0 ; -0.354,0.354 0,0 ; 0.354,-0.354 0,0 ; 0.354,0.354 0,0 ; -1,-0.91 -0.5,-0.91 -0.5,-0.69 -1,-0.69 ; -1,-0.91 -1,-0.69 ; -1,-0.91 -0.75,-0.8 -1,-0.69 ; -1,-0.51 -0.5,-0.51 -0.5,-0.29 -1,-0.29 ; -1,-0.51 -1,-0.29 ; -1,-0.51 -0.75,-0.4 -1,-0.29 ; -1,-0.11 -0.5,-0.11 -0.5,0.11 -1,0.11 ; -1,-0.11 -1,0.11 ; -1,-0.11 -0.75,0 -1,0.11 ; -1,0.29 -0.5,0.29 -0.5,0.51 -1,0.51 ; -1,0.29 -1,0.51 ; -1,0.29 -0.75,0.4 -1,0.51 ; -1,0.69 -0.5,0.69 -0.5,1.01 -1,1.01 ; -1,0.69 -1,1.01 ; -1,0.69 -0.75,0.85 -1,1.01 ; -0.11,-1.15 0.11,-1.15 ; -0.11,-1.15 -0.11,-0.5 ; -0.11,-1.15 0.11,-1.15 ; -0.11,-1.15 -0.11,-0.5 ; -0.11,-1.15 0,-0.825 0.11,-1.15 ; -0.11,-0.5 0.11,-0.5 ; -0.11,-0.5 0.11,-0.5 ; -0.11,1.15 0.11,1.15 ; -0.11,1.15 -0.11,0.5 0.11,0.5 0.11,1.15 ; -0.11,1.15 0,0.825 0.11,1.15 ; 0.11,-1.15 0.11,-0.5 ; 0.11,-1.15 0.11,-0.5 ; 1,-0.91 1,-0.69 ; 1,-0.91 0.5,-0.91 0.5,-0.69 1,-0.69 ; 1,-0.91 0.75,-0.8 1,-0.69 ; 1,-0.51 1,-0.29 ; 1,-0.51 0.5,-0.51 0.5,-0.29 1,-0.29 ; 1,-0.51 0.75,-0.4 1,-0.29 ; 1,-0.11 1,0.11 ; 1,-0.11 0.5,-0.11 0.5,0.11 1,0.11 ; 1,-0.11 0.75,0 1,0.11 ; 1,0.29 1,0.51 ; 1,0.29 0.5,0.29 0.5,0.51 1,0.51 ; 1,0.29 0.75,0.4 1,0.51 ; 1,0.69 1,0.91 ; 1,0.69 0.5,0.69 0.5,0.91 1,0.91 ; 1,0.69 0.75,0.8 1,0.91
Mechanical 14:
  lines w0.1: -0.9,0.05 0.1,1.05 ; -0.9,0.15 0,1.05 ; -0.9,0.25 -0.1,1.05 ; -0.9,0.35 -0.2,1.05 ; -0.9,0.45 -0.3,1.05 ; -0.9,0.55 -0.4,1.05 ; -0.9,0.65 -0.5,1.05 ; -0.9,0.75 -0.6,1.05 ; -0.9,0.85 -0.7,1.05 ; -0.9,0.95 -0.8,1.05 ; -0.9,-1.05 0.9,-1.05 0.9,1.05 -0.9,1.05 -0.9,-1.05
Mechanical 15:
  lines w0.05: -1.25,-1.4 1.25,-1.4 1.25,1.4 -1.25,1.4 -1.25,-1.4
3D body "NXP_SOT1174-1.stp": height 0.5, standoff 0, extent -0.9,-1.05 0.9,1.05

## OMRON_EE-SX1107 [mm] "OMRON 3.4mm x 3mm x 3mm Photomicrosensor"
height 3.15
pads (4):
  rect 1.8x1.2 smd: 1(-1.8,0.8) 2(-1.8,-0.8) 3(1.8,-0.8) 4(1.8,0.8)
Top Overlay:
  lines w0.2: -0.7,-1.5 0.6,-1.5 0.6,1.5 -0.7,1.5 ; -0.5,-1.5 -0.5,1.5 ; 0.4,-1.5 0.4,1.5 ; 0.5,-1.5 0.5,1.5 0.5,-1.5
Mechanical 8:
  lines w0.1: -2.3,-0.8 -1.8,-0.8 ; -2.3,0.8 -1.8,0.8 ; -1.8,-1.3 -1.8,-0.8 ; -1.8,-0.3 -1.8,-0.8 ; -1.8,0.3 -1.8,0.8 ; -1.8,1.3 -1.8,0.8 ; -1.3,-0.8 -1.8,-0.8 ; -1.3,0.8 -1.8,0.8 ; -0.5,0 0,0 ; 0,-0.5 0,0 ; 0,0.5 0,0 ; 0.5,0 0,0 ; 1.3,-0.8 1.8,-0.8 ; 1.3,0.8 1.8,0.8 ; 1.8,-1.3 1.8,-0.8 ; 1.8,-0.3 1.8,-0.8 ; 1.8,0.3 1.8,0.8 ; 1.8,1.3 1.8,0.8 ; 2.3,-0.8 1.8,-0.8 ; 2.3,0.8 1.8,0.8 ; -2.7,-1.4 -2.7,-0.2 -0.9,-0.2 -0.9,-1.4 -2.7,-1.4 ; -2.7,0.2 -0.9,0.2 -0.9,1.4 -2.7,1.4 -2.7,0.2 ; 0.9,-1.4 2.7,-1.4 2.7,-0.2 0.9,-0.2 0.9,-1.4 ; 0.9,0.2 2.7,0.2 2.7,1.4 0.9,1.4 0.9,0.2
Mechanical 14:
  lines w0.1: -1.2,-1.5 -1.2,1.5 ; -0.5,-1.5 -0.5,1.5 ; 0.5,-1.5 0.5,1.5 ; 0.6,-1.5 0.6,1.5 ; 0.65,-1.5 0.65,1.5 ; 0.7,-1.5 0.7,1.5 ; 1.2,-1.5 1.2,1.5 ; -1.7,-1.5 -1.7,1.5 1.7,1.5 1.7,-1.5 -1.7,-1.5
  text "E" at 2,-1.2 h0.8
  text "C" at 2,0.4 h0.8
  text "K" at -2.5,-1.2 h0.8
  text "A" at -2.5,0.4 h0.8
Mechanical 15:
  lines w0.05: -2.95,-1.75 2.95,-1.75 2.95,1.75 -2.95,1.75 -2.95,-1.75
3D body "OMRON_EE-SX1107.stp": height 3, standoff 0, extent -1.7,-1.5 1.7,1.5

## ONSEMI_CASE 403A-03 [mm] "ONSEMICONDUCTOR CASE 403A-03, 2-Leads, Body 4.32mm x 3.56mm"
height 2.47
pads (2):
  rect 2.16x2.75 smd: 1(-2.21,0) 2(2.21,0)
Top Overlay:
  circle w0.25: c-3.8,0 r0.125
  lines w0.2: -2.3,-1.675 -2.3,-1.95 2.3,-1.95 2.3,-1.675 ; -2.3,1.675 -2.3,1.95 2.3,1.95 2.3,1.675
Mechanical 8:
  lines w0.05: -3.29,-1.375 -3.29,1.375 ; -3.29,-1.375 -1.13,-1.375 -1.13,1.375 -3.29,1.375 ; -3.29,-1.375 -2.21,0 -3.29,1.375 ; 3.29,-1.375 3.29,1.375 ; 3.29,-1.375 1.13,-1.375 1.13,1.375 3.29,1.375 ; 3.29,-1.375 2.21,0 3.29,1.375
  lines w0.1: -0.5,0 0,0 ; 0,-0.5 0,0 ; 0,0.5 0,0 ; 0.5,0 0,0
Mechanical 14:
  lines w0.1: -2.2,-1.95 -2.2,1.95 ; -2.1,-1.95 -2.1,1.95 ; -2,-1.95 -2,1.95 ; -1.9,-1.95 -1.9,1.95 ; -1.8,-1.95 -1.8,1.95 ; -1.7,-1.95 -1.7,1.95 ; -1.6,-1.95 -1.6,1.95 ; -2.3,-1.95 2.3,-1.95 2.3,1.95 -2.3,1.95 -2.3,-1.95
Mechanical 15:
  circle w0.05: c0,0 r0.35
  lines w0.05: -0.5,0 0.5,0 ; 0,-0.5 0,0.5 ; -3.54,-2.2 3.54,-2.2 3.54,2.2 -3.54,2.2 -3.54,-2.2
3D body "ONSEMI_CASE 403A-03.stp": height 2.47, standoff 0, extent -2.7,-1.95 2.7,1.95